# Altium footprint library Connectors.PcbLib: 155 footprints (part 3 of 10)
Each footprint in its own frame and in the unit in brackets; x right, y up, seen from the top. Pads: shape width x height; smd on the part's side, far side on the other; paste and mask are expansions set on the pad; w line width, h text height; cw(c..) or ccw(c..) is an arc to the next point about the centre after c.
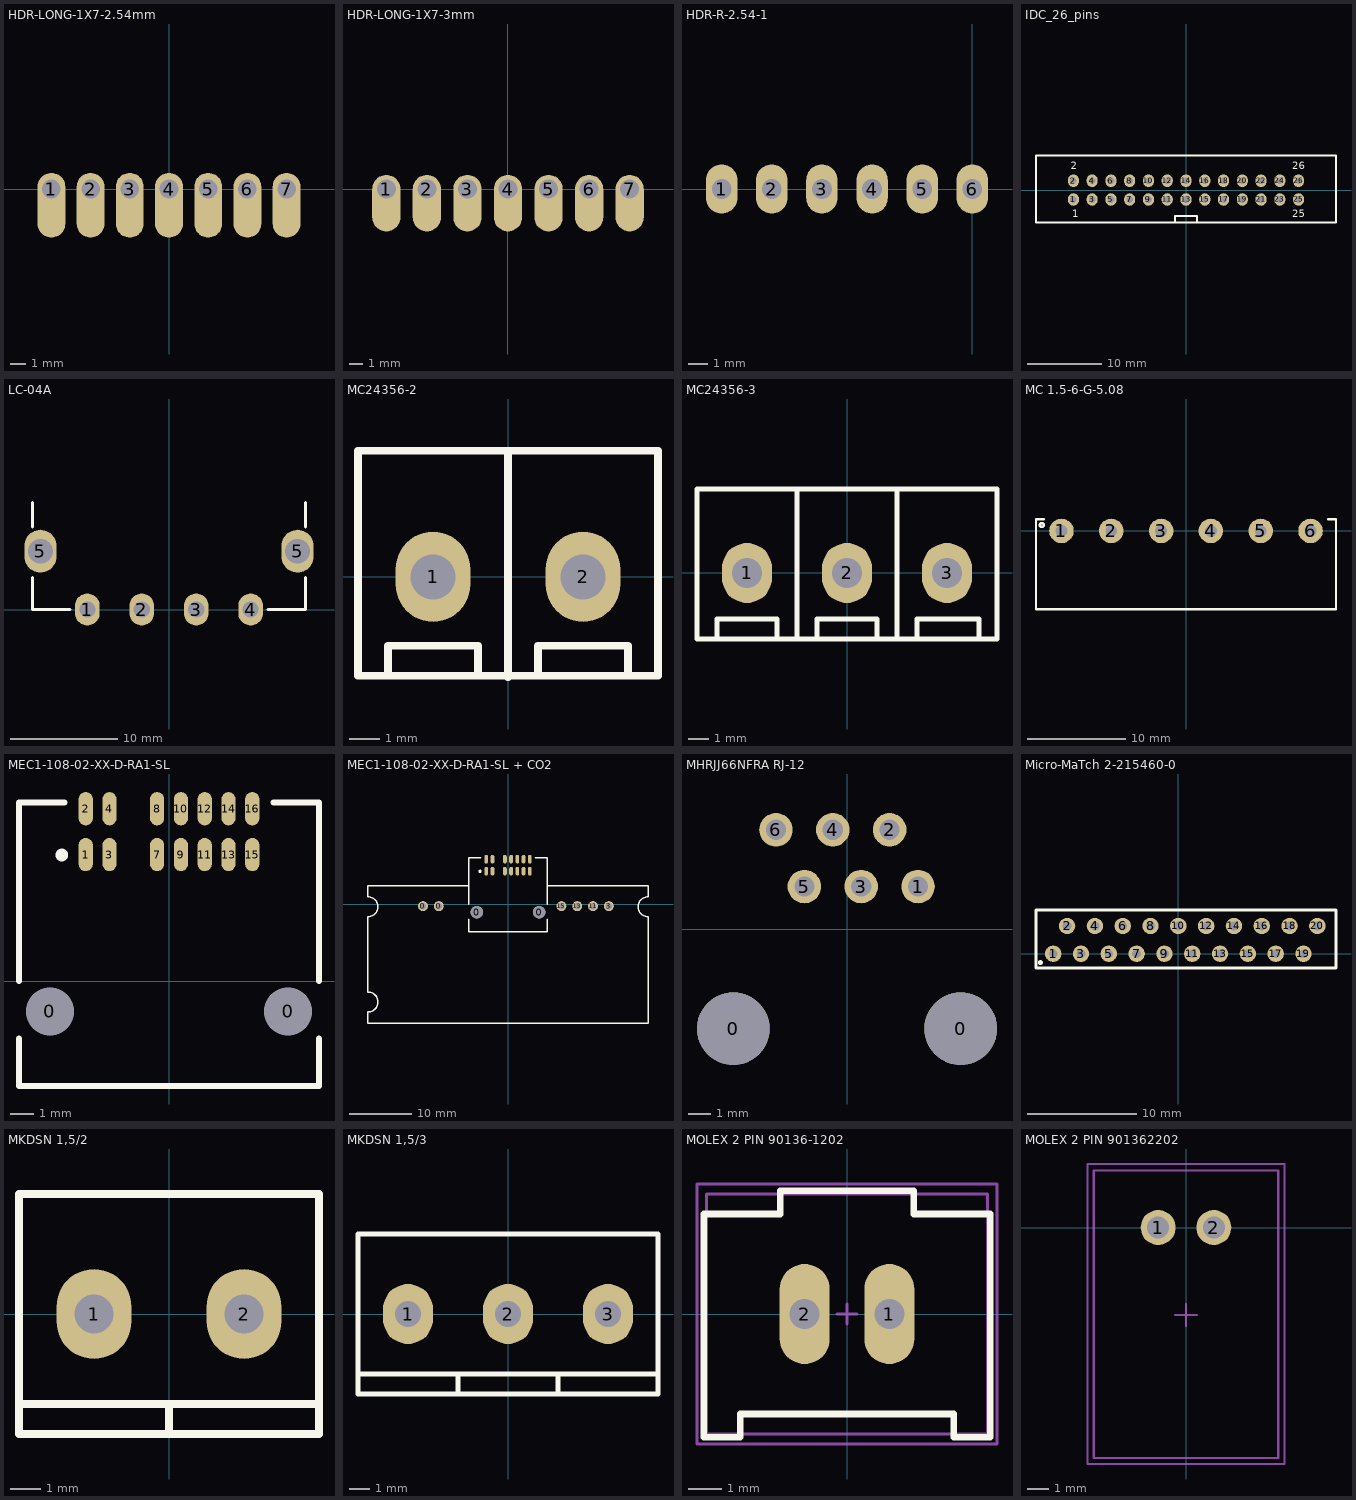
[diagram p2: the footprints below, top view; thin cyan lines are the x and y axes]

## HDR-LONG-1X7-2.54mm [mm] "Pads for through-hole wire soldering. 2.54mm step."
pads (7):
  oval 1.8x4.2 hole 1.2 copper offset 0,-1.05: 1(-7.62,0) 2(-5.08,0) 3(-2.54,0) 4(0,0) 5(2.54,0) 6(5.08,0) 7(7.62,0)

## HDR-LONG-1X7-3mm [mm] "Pads for through-hole wire soldering. 3mm step."
pads (7):
  oval 2.1x4.2 hole 1.4 copper offset 0,-1.05: 1(-8.995,0) 2(-5.995,0) 3(-2.995,0) 4(0.005,0) 5(3.005,0) 6(6.005,0) 7(9.005,0)

## HDR-R-2.54-1 [mm] "Header, Right Angle, 2.54mm, 1mm hole, oval pads"
pads (6):
  oval 1.6x2.5 hole 1: 1(-12.7,0) 2(-10.16,0) 3(-7.62,0) 4(-5.08,0) 5(-2.54,0) 6(0,0)
3D body: height 4.12, standoff -6.01, extent -13.97,-4.265 1.27,1.25

## IDC_26_pins [mm] "IDC_26_pins"
height 9.5
pads (26):
  oval 1.5x1.7 hole 0.9: 1(-15.24,-1.27) 2(-15.24,1.27) 3(-12.7,-1.27) 4(-12.7,1.27) 5(-10.16,-1.27) 6(-10.16,1.27) 7(-7.62,-1.27) 8(-7.62,1.27) 9(-5.08,-1.27) 10(-5.08,1.27) 11(-2.54,-1.27) 12(-2.54,1.27) 13(0,-1.27) 14(0,1.27) 15(2.54,-1.27) 16(2.54,1.27) 17(5.08,-1.27) 18(5.08,1.27) 19(7.62,-1.27) 20(7.62,1.27) 21(10.16,-1.27) 22(10.16,1.27) 23(12.7,-1.27) 24(12.7,1.27) 25(15.24,-1.27) 26(15.24,1.27)
Top Overlay:
  lines w0.254: -1.5,-4.4 -1.5,-3.5 1.5,-3.5 1.5,-4.4 ; -20.3,-4.4 -20.3,4.7 20.3,4.7 20.3,-4.4 -20.3,-4.4
  text "1" at -15.4,-3.7 h1
  text "2" at -15.6,2.8 h1
  text "25" at 14.4,-3.7 h1
  text "26" at 14.4,2.8 h1
3D body: height 9.6, standoff -5.3, extent -20.32,-4.45 20.32,4.75

## LC-04A [mm] "LC-04A"
height 8
pads (6):
  oval 2.3x3 hole 1.5: 1(-7.62,0) 2(-2.54,0) 3(2.54,0) 4(7.62,0)
  oval 3x4 hole 2.3: 5(-12,5.45) 5(12,5.45)
Top Overlay:
  lines w0.254: -12.75,3 -12.75,0 -9.25,0 ; -12.75,7.7 -12.75,10 ; 9.25,0 12.75,0 12.75,3 ; 12.75,7.7 12.75,10
3D body: height 8.3, standoff -0.8, extent -12.75,0 12.75,11.5

## MC24356-2 [mm] "Terminal Block 5mm 2 position"
height 10
pads (2):
  oval 2.5x3 hole 1.5: 1(-2.5,0) 2(2.5,0)
Top Overlay:
  lines w0.254: -4,-3.3 -4,-2.3 -1,-2.3 -1,-3.3 ; 0,-3.35 0,4.15 ; 1,-3.3 1,-2.3 4,-2.3 4,-3.3 ; -5,-3.3 5,-3.3 5,0 5,4.2 -5,4.2 -5,-3.3
3D body: height 10, standoff -1, extent -5,-3.35 5,4.15

## MC24356-3 [mm] "Terminal Block 5mm 3 position"
height 10
pads (3):
  oval 2.5x3 hole 1.5: 1(-5,0) 2(0,0) 3(5,0)
Top Overlay:
  lines w0.254: -6.5,-3.3 -6.5,-2.3 -3.5,-2.3 -3.5,-3.3 ; -2.5,-3.3 -2.5,4.2 ; -1.5,-3.3 -1.5,-2.3 1.5,-2.3 1.5,-3.3 ; 3.5,-3.3 3.5,-2.3 6.6,-2.3 6.6,-3.3 ; 2.5,-3.3 2.5,0 2.5,4.2 ; 2.5,-3.3 -7.5,-3.3 -7.5,4.2 2.5,4.2 ; 2.5,-3.3 7.5,-3.3 7.5,4.2 2.5,4.2
3D body: height 10, standoff -1, extent -7.5,-3.3 7.5,4.2

## MC 1.5-6-G-5.08 [mm] "MC 1.5-6-G-5.08"
height 7.25
pads (6):
  round 2.5 hole 1.2: 1(-12.7,0) 2(-7.62,0) 3(-2.54,0) 4(2.54,0) 5(7.62,0) 6(12.7,0)
Top Overlay:
  circle w0.254: c-14.7,0.6 r0.2
  lines w0.254: -14.5,1.2 -15.3,1.2 -15.3,-8 15.3,-8 15.3,1.2 14.5,1.2
3D body: height 7.25, standoff -3.5, extent -15.24,-8 15.24,1.2

## MEC1-108-02-XX-D-RA1-SL [mm] "MEC1-108-02-XX-D-RA1-SL"
height 6.81
pads (16):
  round 2 hole 2 unplated: 0(-5,-1.27) 0(5,-1.27)
  oval 0.6x1.4 smd: 1(-3.5,5.321) 2(-3.5,7.245) 3(-2.5,5.321) 4(-2.5,7.245) 7(-0.5,5.321) 8(-0.5,7.245) 9(0.5,5.321) 10(0.5,7.245) 11(1.5,5.321) 12(1.5,7.245) 13(2.5,5.321) 14(2.5,7.245) 15(3.5,5.321) 16(3.5,7.245)
Top Overlay:
  circle w0.254: c-4.5,5.3 r0.141
  lines w0.254: -6.3,-2.4 -6.3,-4.4 6.3,-4.4 6.3,-2.4 ; -6.3,0 -6.3,7.5 -4.4,7.5 ; 4.4,7.5 6.3,7.5 6.3,0
3D body: height 6.85, standoff -1.22, extent -6.27,-4.445 6.27,7.53

## MEC1-108-02-XX-D-RA1-SL + CO2 [mm] "MEC1-108-02-XX-D-RA1-SL + CO2"
height 6.81
pads (22):
  round 1.6 hole 1: 0(-13.66,-0.3) 0(-11.12,-0.3) 3(16.2,-0.3) 11(13.66,-0.3) 13(11.12,-0.3) 15(8.58,-0.3)
  round 2 hole 2 unplated: 0(-5,-1.27) 0(5,-1.27)
  oval 0.6x1.4 smd: 1(-3.5,5.321) 2(-3.5,7.245) 3(-2.5,5.321) 4(-2.5,7.245) 7(-0.5,5.321) 8(-0.5,7.245) 9(0.5,5.321) 10(0.5,7.245) 11(1.5,5.321) 12(1.5,7.245) 13(2.5,5.321) 14(2.5,7.245) 15(3.5,5.321) 16(3.5,7.245)
Top Overlay:
  circle w0.254: c-4.5,5.3 r0.141
  lines w0.254: -6.3,-2.4 -6.3,-4.4 6.3,-4.4 6.3,-2.4 ; -6.3,0 -6.3,7.5 -4.4,7.5 ; -6.3,3 -22.5,3 -22.5,1.2 cw(c-22.5,-0.4) -22.5,-2 -22.5,-14.1 cw(c-22.5,-15.7) -22.5,-17.3 -22.5,-19.1 22.5,-19.1 22.5,-2 cw(c22.5,-0.4) 22.5,1.2 22.5,3 6.3,3 ; 4.4,7.5 6.3,7.5 6.3,0
3D body: height 16.21, standoff -1.27, extent -22.5,-19.045 22.5,7.529

## MHRJJ66NFRA RJ-12 [mm] "RJ-12"
pads (8):
  round 3.25 hole 3.25 unplated: 0(-5.08,-4.445) 0(5.08,-4.445)
  round 1.5 hole 0.9 unplated: 1(3.175,1.905) 2(1.905,4.445) 3(0.635,1.905) 4(-0.635,4.445) 5(-1.905,1.905) 6(-3.175,4.445)
3D body: height 11.75, standoff -3.5, extent -6.5,-12.3 6.7,5.7

## Micro-MaTch 2-215460-0 [mm] "20 pins"
height 5.8
pads (20):
  round 1.5 hole 0.8: 1(-11.43,0) 2(-10.16,2.54) 3(-8.89,0) 4(-7.62,2.54) 5(-6.35,0) 6(-5.08,2.54) 7(-3.81,0) 8(-2.54,2.54) 9(-1.27,0) 10(0,2.54) 11(1.27,0) 12(2.54,2.54) 13(3.81,0) 14(5.08,2.54) 15(6.35,0) 16(7.62,2.54) 17(8.89,0) 18(10.16,2.54) 19(11.43,0) 20(12.7,2.54)
Top Overlay:
  circle w0.254: c-12.6,-0.8 r0.1
  lines w0.254: -13,-1.3 14.4,-1.3 14.4,4 -13,4 -13,-1.3
3D body: height 5.8, standoff -1, extent -12.965,-1.3 14.365,4

## MKDSN 1,5/2 [mm] "MKDSN 1,5/2"
height 10
pads (2):
  oval 2.5x3 hole 1.3: 1(-2.5,0) 2(2.5,0)
Top Overlay:
  lines w0.254: -5,-3 5,-3 ; 0,-4 0,-3 ; -5,-4 -5,4 5,4 5,-4 -5,-4

## MKDSN 1,5/3 [mm] "MKDSN 1,5/3"
height 10
pads (3):
  oval 2.5x3 hole 1.3: 1(-5,0) 2(0,0) 3(5,0)
Top Overlay:
  lines w0.254: -7.5,-3 7.5,-3 ; -2.5,-4 -2.5,-3 ; 2.5,-4 2.5,-3 ; -7.5,-4 7.5,-4 7.5,4 -7.5,4 -7.5,-4

## MOLEX 2 PIN 90136-1202 [mm] "90136-1202 C-Grid III, 2 pins, Straight"
height 10.9
pads (2):
  oval 1.5x3 hole 0.9: 1(1.27,0) 2(-1.27,0)
Top Overlay:
  lines w0.2: -4.3,-3.7 -4.3,3 -2,3 -2,3.7 2,3.7 2,3 4.3,3 4.3,-3.7 3.2,-3.7 3.2,-3 -3.2,-3 -3.2,-3.7 -4.3,-3.7
Mechanical 13:
  lines w0.1: -4.215,-3.6 -4.215,3.6 4.215,3.6 4.215,-3.6 -4.215,-3.6
  text "2" at -1.5,-2.4 h0.6
  text "1" at 1.2,-2.4 h0.6
Mechanical 15:
  lines w0.1: -0.3,0 0.3,0 ; 0,-0.3 0,0.3 ; -4.5,-3.9 -4.5,3.9 4.5,3.9 4.5,-3.9 -4.5,-3.9
3D body: height 10.95, standoff -2.85, extent -4.215,-3.605 4.215,3.605

## MOLEX 2 PIN 901362202 [mm] "901362202 C-Grid III, 2 pins, Right Angle"
height 7.21
pads (2):
  round 1.6 hole 1: 1(-1.27,0) 2(1.27,0)
Mechanical 13:
  lines w0.1: -4.215,-10.53 -4.215,2.61 4.215,2.61 4.215,-10.53 -4.215,-10.53
Mechanical 15:
  lines w0.1: -0.5,-4 0.5,-4 ; 0,-4.5 0,-3.5 ; -4.5,-10.8 -4.5,2.9 4.5,2.9 4.5,-10.8 -4.5,-10.8
3D body: height 7.2, standoff -2.91, extent -4.215,-10.53 4.215,2.61